# Altium schematic symbol library IC_TI.SCHLIB: 1162 symbols (part 5 of 8)
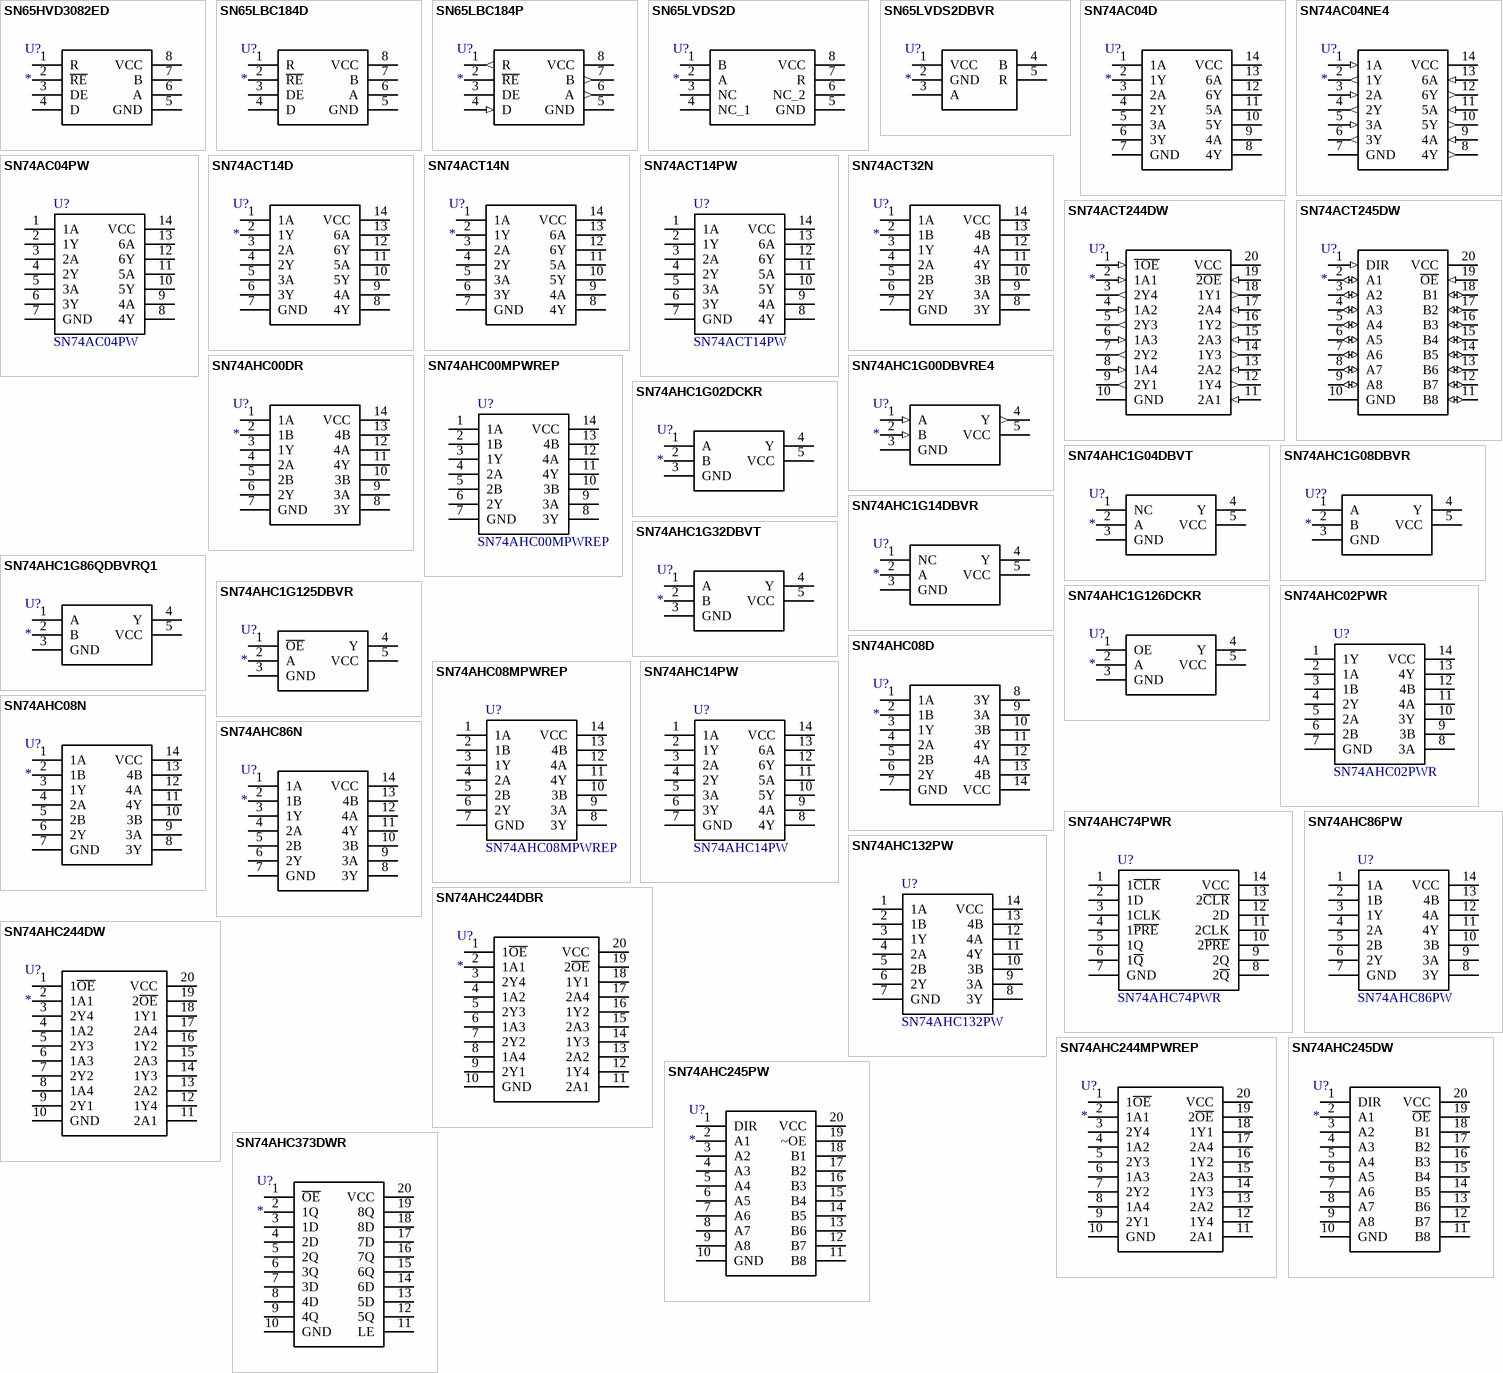
[diagram p39: symbols SN65HVD3082ED to SN74AHC373DWR]

## SN74AHC1G86QDBVRQ1
designator U?
Integrated Circuit; Manufacturer_Name: Texas Instruments; Manufacturer_Part_Number: SN74AHC1G86QDBVRQ1; Datasheet Link: http://www.ti.com/lit/gpn/sn74ahc1g86-q1; Height: 1.45mm; Mouser Part Number: 595-74AHC1G86QDBVRQ1; Mouser Price/Stock: https://www.mouser.com/Search/Refine.aspx?Keyword=595-74AHC1G86QDBVRQ1
footprint SOT23-5 (SOT23, 5-Leads, Body 3.0x3.0mm (max), Pitch 0.95mm, IPC Medium Density)
pins: 1 A, 2 B, 3 GND, 4 Y, 5 VCC

## SN74AHC1G125DBVR
designator U?
Integrated Circuit; Manufacturer_Name: Texas Instruments; Manufacturer_Part_Number: SN74AHC1G125DBVR; Datasheet Link: http://www.ti.com/lit/ds/symlink/sn74ahc1g125.pdf; Height: 1.45mm; Mouser Part Number: 595-SN74AHC1G125DBVR; Mouser Price/Stock: https://www.mouser.com/Search/Refine.aspx?Keyword=595-SN74AHC1G125DBVR; RS Part Number: 1456688; RS Price/Stock: http://uk.rs-online.com/web/p/products/1456688
footprint SOT23-5 (SOT23, 5-Leads, Body 3.0x3.0mm (max), Pitch 0.95mm, IPC Medium Density)
pins: 1 ~{OE}, 2 A, 3 GND (power), 4 Y, 5 VCC (power)

## SN74AHC1G126DCKR
designator U?
Integrated Circuit; Manufacturer_Name: Texas Instruments; Manufacturer_Part_Number: SN74AHC1G126DCKR; Datasheet Link: http://www.ti.com/lit/ds/symlink/sn74ahc1g126.pdf; Height: 1.1mm; Mouser Part Number: 595-SN74AHC1G126DCKR; Mouser Price/Stock: https://www.mouser.com/Search/Refine.aspx?Keyword=595-SN74AHC1G126DCKR; RS Part Number: 6518074; RS Price/Stock: http://uk.rs-online.com/web/p/products/6518074
footprint SOT353
pins: 1 OE, 2 A, 3 GND (power), 4 Y, 5 VCC (power)

## SN74AHC02PWR
designator U?
Integrated Circuit; Manufacturer_Name: Texas Instruments; Datasheet Link: http://www.ti.com/lit/gpn/sn74ahc02; Height: 1.2mm; Manufacturer_Part_Number: SN74AHC02PWR; Mouser Part Number: 595-SN74AHC02PWR; Mouser Price/Stock: https://www.mouser.com/Search/Refine.aspx?Keyword=595-SN74AHC02PWR; RS Part Number: 1695659; RS Price/Stock: http://uk.rs-online.com/web/p/products/1695659
footprint TSSOP14_0.65 (TSOP, 14-Leads, Body 5.00x4.40mm, Pitch 0.65mm, Thermal Pad 2.31x2.46mm, IPC Low Density)
pins: 1 1Y, 2 1A, 3 1B, 4 2Y, 5 2A, 6 2B, 7 GND, 8 3A, 9 3B, 10 3Y, 11 4A, 12 4B, 13 4Y, 14 VCC

## SN74AHC08D
designator U?
Integrated Circuit; Manufacturer_Name: Texas Instruments; Manufacturer_Part_Number: SN74AHC08D; Mouser Part Number: 595-SN74AHC08D; Mouser Price/Stock: https://www.mouser.com/Search/Refine.aspx?Keyword=595-SN74AHC08D; RS Part Number: 1450164; RS Price/Stock: http://uk.rs-online.com/web/p/products/1450164
footprint SOIC14_1.27
pins: 1 1A, 2 1B, 3 1Y, 4 2A, 5 2B, 6 2Y, 7 GND, 8 3Y, 9 3A, 10 3B, 11 4Y, 12 4A, 13 4B, 14 VCC

## SN74AHC08MPWREP
designator U?
Integrated Circuit; Manufacturer_Name: Texas Instruments; Datasheet Link: http://www.ti.com/lit/gpn/sn74ahc08-ep; Height: 1.2mm; Manufacturer_Part_Number: SN74AHC08MPWREP; Mouser Part Number: 595-SN74AHC08MPWREP; Mouser Price/Stock: https://www.mouser.com/Search/Refine.aspx?Keyword=595-SN74AHC08MPWREP
footprint TSSOP14_0.65 (TSOP, 14-Leads, Body 5.00x4.40mm, Pitch 0.65mm, Thermal Pad 2.31x2.46mm, IPC Low Density)
pins: 1 1A, 2 1B, 3 1Y, 4 2A, 5 2B, 6 2Y, 7 GND, 8 3Y, 9 3A, 10 3B, 11 4Y, 12 4A, 13 4B, 14 VCC

## SN74AHC08N
designator U?
Integrated Circuit; Manufacturer_Name: Texas Instruments; Manufacturer_Part_Number: SN74AHC08N; Datasheet Link: http://www.ti.com/lit/gpn/sn74ahc08; Mouser Part Number: 595-SN74AHC08N; Mouser Price/Stock: https://www.mouser.com/Search/Refine.aspx?Keyword=595-SN74AHC08N; RS Part Number: 2508717481; RS Price/Stock: http://uk.rs-online.com/web/p/products/2508717481
footprint DIP14
pins: 1 1A, 2 1B, 3 1Y, 4 2A, 5 2B, 6 2Y, 7 GND, 8 3Y, 9 3A, 10 3B, 11 4Y, 12 4A, 13 4B, 14 VCC

## SN74AHC14PW
designator U?
Integrated Circuit; Manufacturer_Name: Texas Instruments; Manufacturer_Part_Number: SN74AHC14PW; Mouser Part Number: 595-SN74AHC14PW; Mouser Price/Stock: https://www.mouser.com/Search/Refine.aspx?Keyword=595-SN74AHC14PW
footprint TSSOP14_0.65 (TSOP, 14-Leads, Body 5.00x4.40mm, Pitch 0.65mm, Thermal Pad 2.31x2.46mm, IPC Low Density)
pins: 1 1A, 2 1Y, 3 2A, 4 2Y, 5 3A, 6 3Y, 7 GND, 8 4Y, 9 4A, 10 5Y, 11 5A, 12 6Y, 13 6A, 14 VCC

## SN74AHC74PWR
designator U?
Integrated Circuit; Manufacturer_Name: Texas Instruments; Datasheet Link: http://www.ti.com/lit/gpn/sn74ahc74; Height: 1.2mm; Manufacturer_Part_Number: SN74AHC74PWR; Mouser Part Number: 595-SN74AHC74PWR; Mouser Price/Stock: https://www.mouser.com/Search/Refine.aspx?Keyword=595-SN74AHC74PWR; RS Part Number: 6627806; RS Price/Stock: http://uk.rs-online.com/web/p/products/6627806
footprint TSSOP14_0.65 (TSOP, 14-Leads, Body 5.00x4.40mm, Pitch 0.65mm, Thermal Pad 2.31x2.46mm, IPC Low Density)
pins: 1 1~{CLR}, 2 1D, 3 1CLK, 4 1~{PRE}, 5 1Q, 6 1~{Q}, 7 GND, 8 2~{Q}, 9 2Q, 10 2~{PRE}, 11 2CLK, 12 2D, 13 2~{CLR}, 14 VCC

## SN74AHC86N
designator U?
Integrated Circuit; Manufacturer_Name: Texas Instruments; Manufacturer_Part_Number: SN74AHC86N; Datasheet Link: http://www.ti.com/lit/gpn/sn74ahc86; Mouser Part Number: 595-SN74AHC86N; Mouser Price/Stock: https://www.mouser.com/Search/Refine.aspx?Keyword=595-SN74AHC86N
footprint DIP14
pins: 1 1A, 2 1B, 3 1Y, 4 2A, 5 2B, 6 2Y, 7 GND, 8 3Y, 9 3A, 10 3B, 11 4Y, 12 4A, 13 4B, 14 VCC

## SN74AHC86PW
designator U?
Integrated Circuit; Manufacturer_Name: Texas Instruments; Manufacturer_Part_Number: SN74AHC86PW; Mouser Part Number: 595-SN74AHC86PW; Mouser Price/Stock: https://www.mouser.com/Search/Refine.aspx?Keyword=595-SN74AHC86PW
footprint TSSOP14_0.65 (TSOP, 14-Leads, Body 5.00x4.40mm, Pitch 0.65mm, Thermal Pad 2.31x2.46mm, IPC Low Density)
pins: 1 1A, 2 1B, 3 1Y, 4 2A, 5 2B, 6 2Y, 7 GND, 8 3Y, 9 3A, 10 3B, 11 4Y, 12 4A, 13 4B, 14 VCC

## SN74AHC132PW
designator U?
Integrated Circuit; Manufacturer_Name: Texas Instruments; Manufacturer_Part_Number: SN74AHC132PW; Mouser Part Number: 595-SN74AHC132PW; Mouser Price/Stock: https://www.mouser.com/Search/Refine.aspx?Keyword=595-SN74AHC132PW
footprint TSSOP14_0.65 (TSOP, 14-Leads, Body 5.00x4.40mm, Pitch 0.65mm, Thermal Pad 2.31x2.46mm, IPC Low Density)
pins: 1 1A, 2 1B, 3 1Y, 4 2A, 5 2B, 6 2Y, 7 GND, 8 3Y, 9 3A, 10 3B, 11 4Y, 12 4A, 13 4B, 14 VCC

## SN74AHC244DBR
designator U?
Integrated Circuit; Manufacturer_Name: Texas Instruments; Manufacturer_Part_Number: SN74AHC244DBR; Datasheet Link: http://www.ti.com/lit/gpn/sn74ahc244; Height: 2mm; Mouser Part Number: 595-SN74AHC244DBR; Mouser Price/Stock: https://www.mouser.com/Search/Refine.aspx?Keyword=595-SN74AHC244DBR; RS Part Number: 6627743P; RS Price/Stock: http://uk.rs-online.com/web/p/products/6627743P
footprint TSSOP20W_0.65
pins: 1 1~{OE}, 2 1A1, 3 2Y4, 4 1A2, 5 2Y3, 6 1A3, 7 2Y2, 8 1A4, 9 2Y1, 10 GND, 11 2A1, 12 1Y4, 13 2A2, 14 1Y3, 15 2A3, 16 1Y2, 17 2A4, 18 1Y1, 19 2~{OE}, 20 VCC

## SN74AHC244DW
designator U?
Integrated Circuit; Manufacturer_Name: Texas Instruments; Manufacturer_Part_Number: SN74AHC244DW; Datasheet Link: http://docs-emea.rs-online.com/webdocs/0b80/0900766b80b80159.pdf; Height: 2.65mm; Mouser Part Number: 595-SN74AHC244DW; Mouser Price/Stock: https://www.mouser.com/Search/Refine.aspx?Keyword=595-SN74AHC244DW; RS Part Number: 2508243766; RS Price/Stock: http://uk.rs-online.com/web/p/products/2508243766
footprint SOIC20W_1.27
pins: 1 1~{OE}, 2 1A1, 3 2Y4, 4 1A2, 5 2Y3, 6 1A3, 7 2Y2, 8 1A4, 9 2Y1, 10 GND (power), 11 2A1, 12 1Y4, 13 2A2, 14 1Y3, 15 2A3, 16 1Y2, 17 2A4, 18 1Y1, 19 2~{OE}, 20 VCC (power)

## SN74AHC244MPWREP
designator U?
Integrated Circuit; Manufacturer_Name: Texas Instruments; Manufacturer_Part_Number: SN74AHC244MPWREP; Datasheet Link: http://www.ti.com/lit/gpn/sn74ahc244-ep; Height: 1.2mm; Mouser Part Number: 595-SN74AHC244MPWREP; Mouser Price/Stock: https://www.mouser.com/Search/Refine.aspx?Keyword=595-SN74AHC244MPWREP
footprint TSSOP20_0.65 (TSOP, 20-Leads, Body 6.6x4.5mm (max), Pitch 0.65mm, IPC Medium Density)
pins: 1 1~{OE}, 2 1A1, 3 2Y4, 4 1A2, 5 2Y3, 6 1A3, 7 2Y2, 8 1A4, 9 2Y1, 10 GND, 11 2A1, 12 1Y4, 13 2A2, 14 1Y3, 15 2A3, 16 1Y2, 17 2A4, 18 1Y1, 19 2~{OE}, 20 VCC

## SN74AHC245DW
designator U?
Integrated Circuit; Manufacturer_Name: Texas Instruments; Manufacturer_Part_Number: SN74AHC245DW; Datasheet Link: http://www.ti.com/lit/ds/symlink/sn74ahc245.pdf; Height: 2.65mm; Mouser Part Number: 595-SN74AHC245DW; Mouser Price/Stock: https://www.mouser.com/Search/ProductDetail.aspx?qs=Tv815z3GeNRDBvYAM3oWuA%3d%3d; RS Part Number: 6631168P; RS Price/Stock: http://uk.rs-online.com/web/p/products/6631168P
footprint SOIC20W_1.27
pins: 1 DIR, 2 A1, 3 A2, 4 A3, 5 A4, 6 A5, 7 A6, 8 A7, 9 A8, 10 GND (power), 11 B8, 12 B7, 13 B6, 14 B5, 15 B4, 16 B3, 17 B2, 18 B1, 19 ~{OE}, 20 VCC (power)

## SN74AHC245PW
designator U?
Integrated Circuit; Manufacturer_Name: Texas Instruments; Manufacturer_Part_Number: SN74AHC245PW; Mouser Part Number: 595-SN74AHC245PW; Mouser Price/Stock: https://www.mouser.com/Search/Refine.aspx?Keyword=595-SN74AHC245PW
footprint TSSOP20_0.65 (TSOP, 20-Leads, Body 6.6x4.5mm (max), Pitch 0.65mm, IPC Medium Density)
pins: 1 DIR, 2 A1, 3 A2, 4 A3, 5 A4, 6 A5, 7 A6, 8 A7, 9 A8, 10 GND, 11 B8, 12 B7, 13 B6, 14 B5, 15 B4, 16 B3, 17 B2, 18 B1, 19 ~OE, 20 VCC

## SN74AHC373DWR
designator U?
Integrated Circuit; Manufacturer_Name: Texas Instruments; Manufacturer_Part_Number: SN74AHC373DWR; Datasheet Link: http://www.ti.com/lit/ds/symlink/sn74ahc373.pdf; Height: 2.65mm; Mouser Part Number: 595-SN74AHC373DWR; Mouser Price/Stock: https://www.mouser.com/Search/Refine.aspx?Keyword=595-SN74AHC373DWR
footprint SOIC20W_1.27
pins: 1 ~{OE}, 2 1Q, 3 1D, 4 2D, 5 2Q, 6 3Q, 7 3D, 8 4D, 9 4Q, 10 GND, 11 LE, 12 5Q, 13 5D, 14 6D, 15 6Q, 16 7Q, 17 7D, 18 8D, 19 8Q, 20 VCC

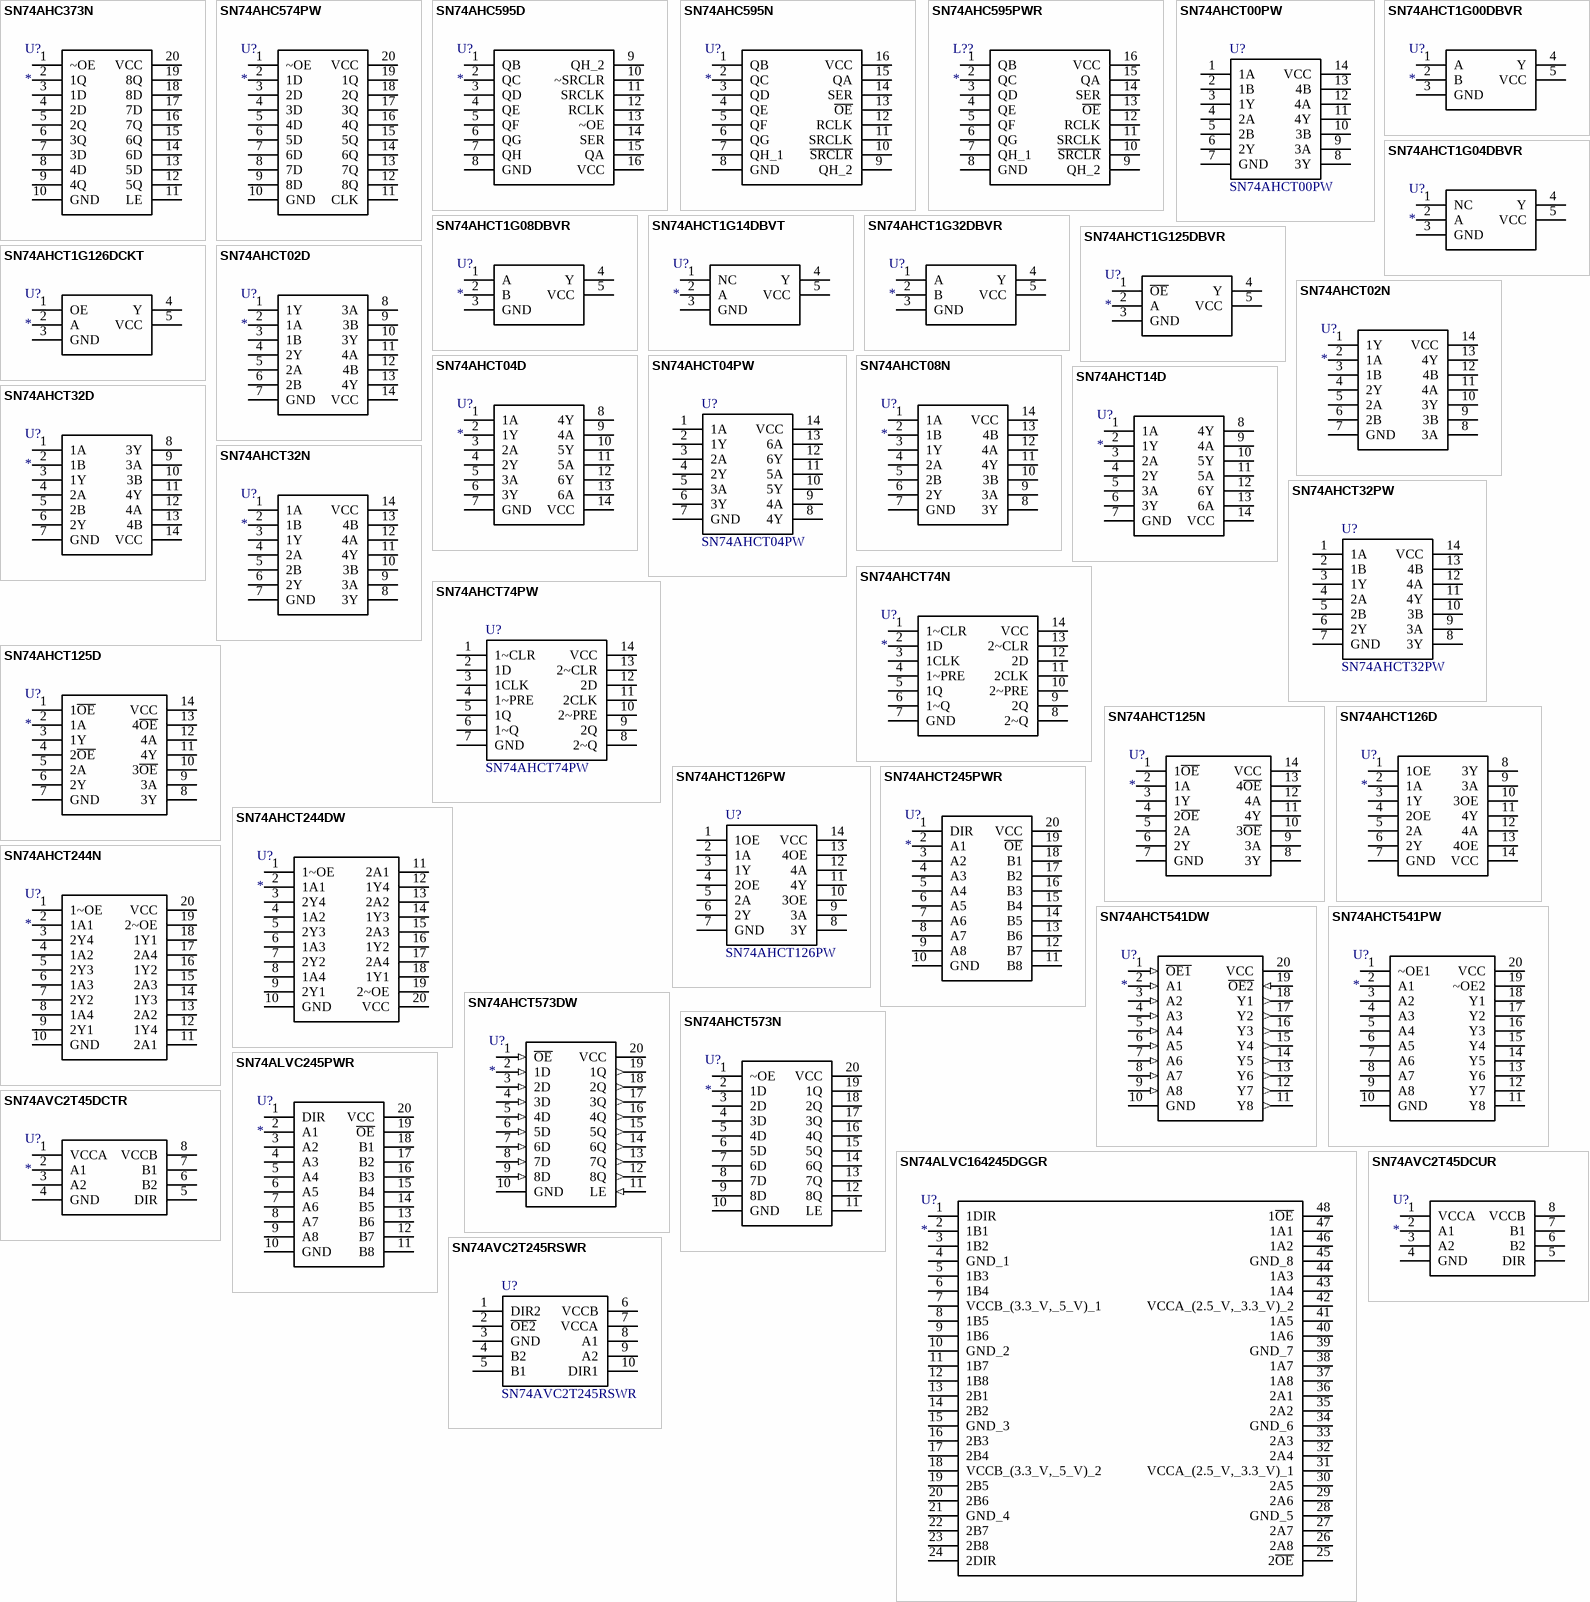
[diagram p19: symbols SN74AHC373N to SN74AVC2T245RSWR]

## SN74AHC373N
designator U?
Integrated Circuit; Manufacturer_Name: Texas Instruments; Manufacturer_Part_Number: SN74AHC373N; Datasheet Link: http://www.ti.com/lit/gpn/sn74ahc373; Mouser Part Number: 595-SN74AHC373N; Mouser Price/Stock: https://www.mouser.com/Search/Refine.aspx?Keyword=595-SN74AHC373N
footprint DIP20
pins: 1 ~OE, 2 1Q, 3 1D, 4 2D, 5 2Q, 6 3Q, 7 3D, 8 4D, 9 4Q, 10 GND, 11 LE, 12 5Q, 13 5D, 14 6D, 15 6Q, 16 7Q, 17 7D, 18 8D, 19 8Q, 20 VCC

## SN74AHC574PW
designator U?
Integrated Circuit; Manufacturer_Name: Texas Instruments; Manufacturer_Part_Number: SN74AHC574PW; Mouser Part Number: 595-SN74AHC574PW; Mouser Price/Stock: https://www.mouser.com/Search/Refine.aspx?Keyword=595-SN74AHC574PW
footprint TSSOP20_0.65 (TSOP, 20-Leads, Body 6.6x4.5mm (max), Pitch 0.65mm, IPC Medium Density)
pins: 1 ~OE, 2 1D, 3 2D, 4 3D, 5 4D, 6 5D, 7 6D, 8 7D, 9 8D, 10 GND, 11 CLK, 12 8Q, 13 7Q, 14 6Q, 15 5Q, 16 4Q, 17 3Q, 18 2Q, 19 1Q, 20 VCC

## SN74AHC595D
designator U?
Integrated Circuit; Manufacturer_Name: Texas Instruments; Manufacturer_Part_Number: SN74AHC595D; Mouser Part Number: 595-SN74AHC595D; Mouser Price/Stock: https://www.mouser.com/Search/Refine.aspx?Keyword=595-SN74AHC595D; RS Part Number: 6631206P; RS Price/Stock: http://uk.rs-online.com/web/p/products/6631206P
footprint SOIC16_1.27
pins: 1 QB, 2 QC, 3 QD, 4 QE, 5 QF, 6 QG, 7 QH, 8 GND, 9 QH_2, 10 ~SRCLR, 11 SRCLK, 12 RCLK, 13 ~OE, 14 SER, 15 QA, 16 VCC

## SN74AHC595N
designator U?
Integrated Circuit; Manufacturer_Name: Texas Instruments; Manufacturer_Part_Number: SN74AHC595N; Datasheet Link: http://www.ti.com/general/docs/lit/getliterature.tsp?genericPartNumber=SN74AHC595&&fileType=pdf; Height: 5.08mm; Mouser Part Number: 595-SN74AHC595N; Mouser Price/Stock: https://www.mouser.com/Search/Refine.aspx?Keyword=595-SN74AHC595N; RS Part Number: 8072573; RS Price/Stock: http://uk.rs-online.com/web/p/products/8072573
footprint DIP16-A
pins: 1 QB, 2 QC, 3 QD, 4 QE, 5 QF, 6 QG, 7 QH_1, 8 GND, 9 QH_2, 10 ~{SRCLR}, 11 SRCLK, 12 RCLK, 13 ~{OE}, 14 SER, 15 QA, 16 VCC

## SN74AHC595PWR
designator L??
Inductor; Manufacturer_Name: Texas Instruments; Manufacturer_Part_Number: SN74AHC595PWR; Datasheet Link: http://www.ti.com/lit/gpn/sn74ahc595; Height: 1.2mm; Mouser Part Number: 595-SN74AHC595PWR; Mouser Price/Stock: https://www.mouser.com/Search/Refine.aspx?Keyword=595-SN74AHC595PWR; RS Part Number: 1627059; RS Price/Stock: http://uk.rs-online.com/web/p/products/1627059
footprint TSSOP16_0.65 (Shrink Small Outline; 16 Leads; Body Width 4.4 mm; Pitch 0.65 mm)
pins: 1 QB, 2 QC, 3 QD, 4 QE, 5 QF, 6 QG, 7 QH_1, 8 GND, 9 QH_2, 10 ~{SRCLR}, 11 SRCLK, 12 RCLK, 13 ~{OE}, 14 SER, 15 QA, 16 VCC

## SN74AHCT00PW
designator U?
Integrated Circuit; Manufacturer_Name: Texas Instruments; Manufacturer_Part_Number: SN74AHCT00PW; Mouser Part Number: 595-SN74AHCT00PW; RS Part Number: 8099455P; RS Price/Stock: http://uk.rs-online.com/web/p/products/8099455P
footprint TSSOP14_0.65 (TSOP, 14-Leads, Body 5.00x4.40mm, Pitch 0.65mm, Thermal Pad 2.31x2.46mm, IPC Low Density)
pins: 1 1A, 2 1B, 3 1Y, 4 2A, 5 2B, 6 2Y, 7 GND, 8 3Y, 9 3A, 10 3B, 11 4Y, 12 4A, 13 4B, 14 VCC

## SN74AHCT1G00DBVR
designator U?
Integrated Circuit; Manufacturer_Name: Texas Instruments; Manufacturer_Part_Number: SN74AHCT1G00DBVR; Datasheet Link: http://www.ti.com/lit/gpn/sn74ahct1g00; RS Part Number: 8099468; RS Price/Stock: http://uk.rs-online.com/web/p/products/8099468
footprint SOT23-5 (SOT23, 5-Leads, Body 3.0x3.0mm (max), Pitch 0.95mm, IPC Medium Density)
pins: 1 A, 2 B, 3 GND, 4 Y, 5 VCC

## SN74AHCT1G04DBVR
designator U?
Integrated Circuit; Manufacturer_Name: Texas Instruments; Manufacturer_Part_Number: SN74AHCT1G04DBVR; Datasheet Link: http://www.ti.com/lit/ds/symlink/sn74ahct1g04.pdf; Height: 1.45mm; Mouser Part Number: 595-SN74AHCT1G04DBVR; Mouser Price/Stock: https://www.mouser.com/Search/Refine.aspx?Keyword=595-SN74AHCT1G04DBVR; RS Part Number: 1624280; RS Price/Stock: http://uk.rs-online.com/web/p/products/1624280
footprint SOT23-5 (SOT23, 5-Leads, Body 3.0x3.0mm (max), Pitch 0.95mm, IPC Medium Density)
pins: 1 NC, 2 A, 3 GND (power), 4 Y, 5 VCC (power)

## SN74AHCT1G08DBVR
designator U?
Integrated Circuit; Manufacturer_Name: Texas Instruments; Manufacturer_Part_Number: SN74AHCT1G08DBVR; Datasheet Link: http://docs-emea.rs-online.com/webdocs/0b80/0900766b80b8032f.pdf; Height: 1.45mm; Mouser Part Number: 595-SN74AHCT1G08DBVR; Mouser Price/Stock: https://www.mouser.com/Search/Refine.aspx?Keyword=595-SN74AHCT1G08DBVR; RS Part Number: 1788965; RS Price/Stock: http://uk.rs-online.com/web/p/products/1788965
footprint SOT23-5 (SOT23, 5-Leads, Body 3.0x3.0mm (max), Pitch 0.95mm, IPC Medium Density)
pins: 1 A, 2 B, 3 GND (power), 4 Y, 5 VCC (power)

## SN74AHCT1G14DBVT
designator U?
Integrated Circuit; Manufacturer_Name: Texas Instruments; Manufacturer_Part_Number: SN74AHCT1G14DBVT; Datasheet Link: http://www.ti.com/lit/ds/symlink/sn74ahct1g14.pdf; Height: 1.45mm; Mouser Part Number: 595-SN74AHCT1G14DBVT; Mouser Price/Stock: https://www.mouser.com/Search/Refine.aspx?Keyword=595-SN74AHCT1G14DBVT
footprint SOT23-5 (SOT23, 5-Leads, Body 3.0x3.0mm (max), Pitch 0.95mm, IPC Medium Density)
pins: 1 NC, 2 A, 3 GND, 4 Y, 5 VCC

## SN74AHCT1G32DBVR
designator U?
Integrated Circuit; Manufacturer_Name: Texas Instruments; Manufacturer_Part_Number: SN74AHCT1G32DBVR; Datasheet Link: http://www.ti.com/lit/ds/symlink/sn74ahct1g32.pdf; Height: 1.45mm; Mouser Part Number: 595-SN74AHCT1G32DBVR; Mouser Price/Stock: https://www.mouser.com/Search/Refine.aspx?Keyword=595-SN74AHCT1G32DBVR; RS Part Number: 1624283; RS Price/Stock: http://uk.rs-online.com/web/p/products/1624283
footprint SOT23-5 (SOT23, 5-Leads, Body 3.0x3.0mm (max), Pitch 0.95mm, IPC Medium Density)
pins: 1 A, 2 B, 3 GND (power), 4 Y, 5 VCC (power)

## SN74AHCT1G125DBVR
designator U?
Integrated Circuit; Manufacturer_Name: Texas Instruments; Manufacturer_Part_Number: SN74AHCT1G125DBVR; Datasheet Link: http://www.ti.com/lit/ds/symlink/sn74ahct1g125.pdf; Height: 1.45mm; Mouser Part Number: 595-SNAHCT1G125DBVR; Mouser Price/Stock: https://www.mouser.com/Search/Refine.aspx?Keyword=595-SNAHCT1G125DBVR; RS Part Number: 7968180P; RS Price/Stock: http://uk.rs-online.com/web/p/products/7968180P
footprint SOT23-5 (SOT23, 5-Leads, Body 3.0x3.0mm (max), Pitch 0.95mm, IPC Medium Density)
pins: 1 ~{OE}, 2 A, 3 GND (power), 4 Y, 5 VCC (power)

## SN74AHCT1G126DCKT
designator U?
Integrated Circuit; Manufacturer_Name: Texas Instruments; Manufacturer_Part_Number: SN74AHCT1G126DCKT; Mouser Part Number: 595-SN74AHCT1G126DCK; Mouser Price/Stock: https://www.mouser.com/Search/Refine.aspx?Keyword=595-SN74AHCT1G126DCK
footprint SOT353
pins: 1 OE, 2 A, 3 GND, 4 Y, 5 VCC

## SN74AHCT02D
designator U?
Integrated Circuit; Manufacturer_Name: Texas Instruments; Manufacturer_Part_Number: SN74AHCT02D; Mouser Part Number: 595-SN74AHCT02D; Mouser Price/Stock: https://www.mouser.com/Search/Refine.aspx?Keyword=595-SN74AHCT02D; RS Part Number: 1451237; RS Price/Stock: http://uk.rs-online.com/web/p/products/1451237
footprint SOIC14_1.27
pins: 1 1Y, 2 1A, 3 1B, 4 2Y, 5 2A, 6 2B, 7 GND, 8 3A, 9 3B, 10 3Y, 11 4A, 12 4B, 13 4Y, 14 VCC

## SN74AHCT02N
designator U?
Integrated Circuit; Manufacturer_Name: Texas Instruments; Manufacturer_Part_Number: SN74AHCT02N; Datasheet Link: http://www.ti.com/lit/gpn/sn74ahct02; Mouser Part Number: 595-SN74AHCT02N; Mouser Price/Stock: https://www.mouser.com/Search/Refine.aspx?Keyword=595-SN74AHCT02N; RS Part Number: 8072586; RS Price/Stock: http://uk.rs-online.com/web/p/products/8072586
footprint DIP14
pins: 1 1Y, 2 1A, 3 1B, 4 2Y, 5 2A, 6 2B, 7 GND, 8 3A, 9 3B, 10 3Y, 11 4A, 12 4B, 13 4Y, 14 VCC

## SN74AHCT04D
designator U?
Integrated Circuit; Manufacturer_Name: Texas Instruments; Manufacturer_Part_Number: SN74AHCT04D; Mouser Part Number: 595-SN74AHCT04D; Mouser Price/Stock: https://www.mouser.com/Search/Refine.aspx?Keyword=595-SN74AHCT04D; RS Part Number: 1450447; RS Price/Stock: http://uk.rs-online.com/web/p/products/1450447
footprint SOIC14_1.27
pins: 1 1A, 2 1Y, 3 2A, 4 2Y, 5 3A, 6 3Y, 7 GND, 8 4Y, 9 4A, 10 5Y, 11 5A, 12 6Y, 13 6A, 14 VCC

## SN74AHCT04PW
designator U?
Integrated Circuit; Manufacturer_Name: Texas Instruments; Manufacturer_Part_Number: SN74AHCT04PW; Mouser Part Number: 595-SN74AHCT04PW; Mouser Price/Stock: https://www.mouser.com/Search/Refine.aspx?Keyword=595-SN74AHCT04PW; RS Part Number: 1451071; RS Price/Stock: http://uk.rs-online.com/web/p/products/1451071
footprint TSSOP14_0.65 (TSOP, 14-Leads, Body 5.00x4.40mm, Pitch 0.65mm, Thermal Pad 2.31x2.46mm, IPC Low Density)
pins: 1 1A, 2 1Y, 3 2A, 4 2Y, 5 3A, 6 3Y, 7 GND, 8 4Y, 9 4A, 10 5Y, 11 5A, 12 6Y, 13 6A, 14 VCC
